# Altium schematic symbol library BARKO_SCHLIB.SchLib: 1064 symbols (part 4 of 11)
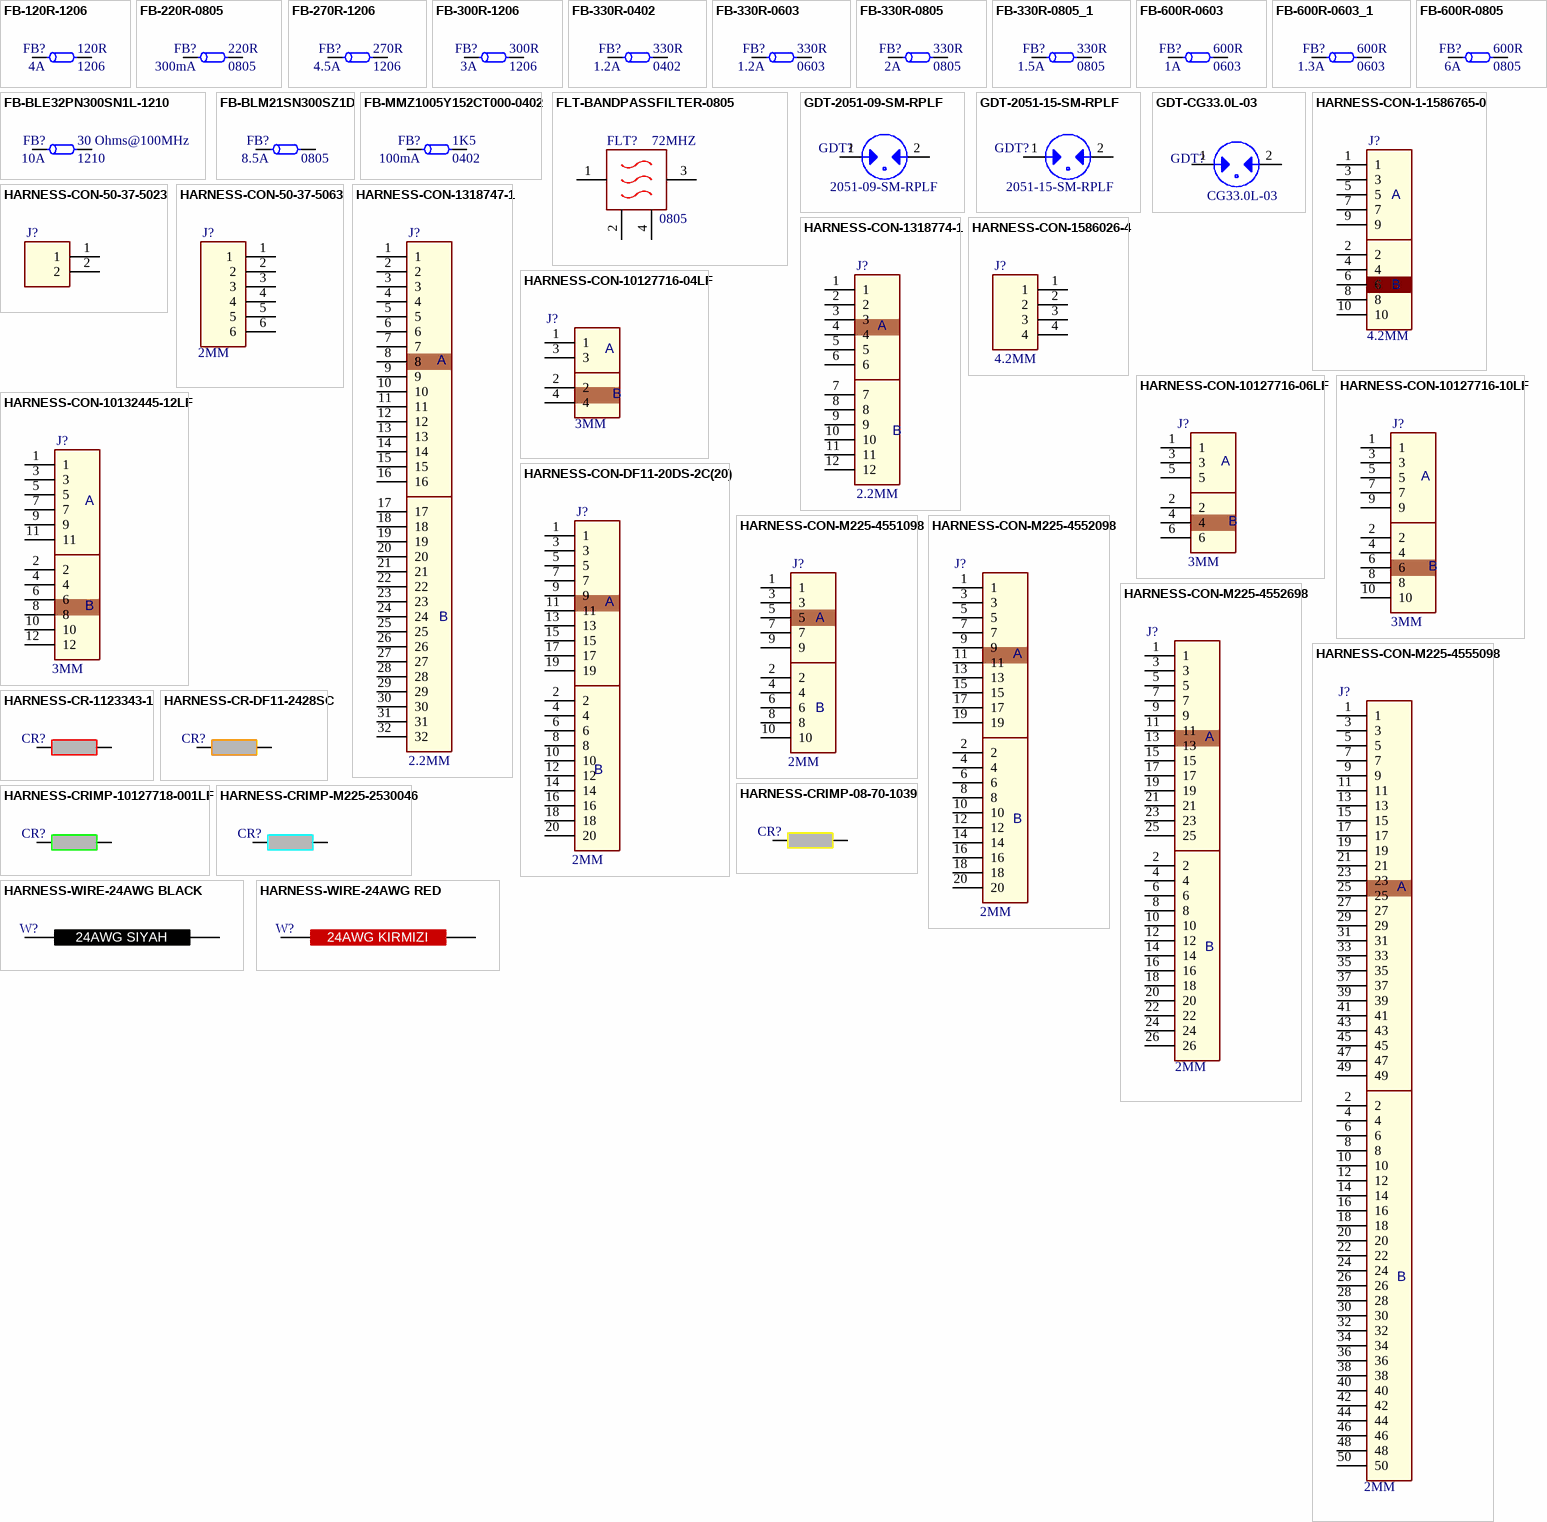
[diagram p44: symbols FB-120R-1206 to HARNESS-WIRE-24AWG RED]

## FB-300R-1206
designator FB?, comment 300R  Current Rating: 3A  Case Code (Imperial): 1206
FERRITE BEAD 300 OHM 1206 1LN; Manufacturer: Wurth Electronics; Manufacturer Part Number: 742792121; Tolerance: 25%; Number of Lines: 1; DC Resistance (DCR): 60mR; Inductance: 560nh; Test Frequency: 110MHz; .PCBCHK: USED; .Creator: F:TALI; Washability: OK; Supplier 1: Digi-Key; Stock 1: 17747; Pricing 1: 1=0.24, 10=0.238, 50=0.219, 100=0.209, 500=0.2, 1000=0.19 (USD); Mount: Surface Mount; Case/Package: SMD/SMT; Weight: 0.000353oz; Core Material: Ferrite; Case Code (Metric): 3216; Material: Ferrite; Min Operating Temperature: -55°C; Max Operating Temperature: 125°C; Package Quantity: 3000; Packaging: Tape and Reel; Impedance: 300R; Max Current Rating: 3A; Max DC Current: 3A; Termination: SMD/SMT; Length: 3.2mm; Height: 1.1mm; Width: 1.6mm; Depth: 1.6mm; REACH SVHC: Unknown; ComponentLink1URL: http://katalog.we-online.de/pbs/datasheet/742792121.pdf; ComponentLink1Description: http://katalog.we-online.de/pbs/datasheet/742792121.pdf; ComponentLink2URL: http://www.farnell.com/datasheets/1910965.pdf; ComponentLink2Description: http://www.farnell.com/datasheets/1910965.pdf; ComponentLink3URL: http://documents.rs-components.com/techlib://itc_doclist_GB.htm?stockno=6694137; ComponentLink3Description: http://documents.rs-components.com/techlib://itc_doclist_GB.htm?stockno=6694137; ComponentLink4URL: http://www.produktinfo.conrad.com/datenblaetter/1000000-1099999/001086998-da-01-ml-WE_CBF_SMD_FERRIT_742792121_de_en.pdf; ComponentLink4Description: http://www.produktinfo.conrad.com/datenblaetter/1000000-1099999/001086998-da-01-ml-WE_CBF_SMD_FERRIT_742792121_de_en.pdf; Supplier Part Number 1: 732-4654-6-ND; .SCHCHK: USED
footprint FB-1206
pins: 1, 2

## FB-330R-0402
designator FB?, comment 330R  Current Rating: 1.2A  Case Code (Imperial): 0402
FERRITE BEAD 330 OHM 0402 1LN; Manufacturer: Murata; Manufacturer Part Number: BLM15PX331SN1D; Material: Steel; Tolerance: 25%; Number of Lines: 1; DC Resistance (DCR): 150mR; Test Frequency: 100MHz; .PCBCHK: USED; .Creator: F:TALI; Washability: OK; Supplier 1: Digi-Key; Stock 1: 36751; Pricing 1: 1=0.15, 10=0.123, 25=0.0956, 50=0.0792, 100=0.0682, 250=0.05456, 500=0.0491, 1000=0.04092, 5000=0.03819 (USD); Case/Package: 0402; Number of Pins: 2; Weight: 2.3E-05oz; Case Code (Metric): 1005; Min Operating Temperature: -55°C; Max Operating Temperature: 125°C; Impedance: 330R; Package Quantity: 1; Packaging: Tape and Reel; Max Current Rating: 1.2A; Termination: SMD/SMT; Max DC Current: 1.2A; Number of Circuits: 1; Length: 1mm; Height: 0.5mm; Width: 0.5mm; Lead Free: Lead Free; ComponentLink1URL: http://search.murata.co.jp/Ceramy/image/img/w_hinm/L0110E.pdf; ComponentLink1Description: http://search.murata.co.jp/Ceramy/image/img/w_hinm/L0110E.pdf; ComponentLink2URL: http://www.produktinfo.conrad.com/datenblaetter/1100000-1199999/001172214-da-01-en-DROSSEL_0402_330R_1_0X0_5MM_10000ST.pdf; ComponentLink2Description: http://www.produktinfo.conrad.com/datenblaetter/1100000-1199999/001172214-da-01-en-DROSSEL_0402_330R_1_0X0_5MM_10000ST.pdf; Supplier Part Number 1: 490-11022-6-ND; .SCHCHK: USED
footprint FB-0402
pins: 1, 2

## FB-330R-0603
designator FB?, comment 330R  Case/Package: 0603  DC Current: 1.2A
FERRITE BEAD 330 OHM 0603 1LN; Manufacturer: Murata; Manufacturer Part Number: BLM18PG331SN1D; Material: Steel,Ferrite; Tolerance: 25%; DC Resistance (DCR): 150mR; Number of Lines: 1; Test Frequency: 100MHz; Shielding: Unshielded; Washability: OK; .Creator: M.OZKAN; .PCBCHK: USED; RoHS: Yes; Number of Pins: 2; Core Material: Ferrite; Case Code (Metric): 1608; Case Code (Imperial): 0603; Min Operating Temperature: -55°C; Max Operating Temperature: 125°C; Impedance: 330R; Package Quantity: 1; Packaging: Tape and Reel; Current Rating: 1.2A; Max Current Rating: 1.2A; Termination: SMD/SMT; Number of Circuits: 1; Length: 1.75mm; Height: 0.8mm; Width: 0.8mm; Depth: 0.95mm; Radiation Hardening: No; REACH SVHC: No SVHC; Lead Free: Lead Free; ComponentLink1URL: https://datasheet.ciiva.com/6211/enfa0003-6211710.pdf?src-supplier=Digi-Key; ComponentLink1Description: https://datasheet.ciiva.com/6211/enfa0003-6211710.pdf?src-supplier=Digi-Key; Max DC Current: 1.2A; .SCHCHK: USED; Supplier 1: Digi-Key; Supplier Part Number 1: 490-5222-1-ND; Stock: 106218; Pricing: 1=0.1, 10=0.076, 25=0.0684, 50=0.05, 100=0.0433, 250=0.0342, 500=0.0288, 1000=0.0243 (USD)
footprint FB-0603
pins: 1, 2

## FB-330R-0805
designator FB?, comment 330R  Current Rating: 2A  Case Code (Imperial): 0805
FERRITE BEAD 330 OHM 0805 1LN; Manufacturer: Wurth Electronics; Manufacturer Part Number: 742792037; Number of Lines: 1; DC Resistance (DCR): 80mR; Test Frequency: 100MHz; Tolerance: 25%; .PCBCHK: USED; .Creator: F:TALI; Washability: OK; Supplier 1: Digi-Key; Stock 1: 4000; Pricing 1: 4000=0.133 (USD); Mount: Surface Mount; Case/Package: SMD/SMT; Number of Pins: 2; Weight: 0.000388oz; Case Code (Metric): 2012; Material: Ferrite; Min Operating Temperature: -55°C; Max Operating Temperature: 125°C; Package Quantity: 1; Packaging: Tape and Reel; Impedance: 330R; Max Current Rating: 2A; Max DC Current: 2A; Termination: SMD/SMT; Resistance: 80mR; Length: 2mm; Height: 0.9mm; Width: 0.047inch; Depth: 1.2mm; REACH SVHC: Unknown; ComponentLink1URL: https://katalog.we-online.de/pbs/datasheet/742792037.pdf; ComponentLink1Description: https://katalog.we-online.de/pbs/datasheet/742792037.pdf; ComponentLink2URL: http://www.mouser.com/ds/2/445/742792037-538141.pdf; ComponentLink2Description: http://www.mouser.com/ds/2/445/742792037-538141.pdf; ComponentLink3URL: http://www.farnell.com/datasheets/530519.pdf; ComponentLink3Description: http://www.farnell.com/datasheets/530519.pdf; ComponentLink4URL: https://www.distrelec.biz/Web/Downloads/_t/ds/742792037_eng_tds.pdf?mime=application%2Fpdf; ComponentLink4Description: https://www.distrelec.biz/Web/Downloads/_t/ds/742792037_eng_tds.pdf?mime=application%2Fpdf; ComponentLink5URL: http://www.produktinfo.conrad.com/datenblaetter/1000000-1099999/001086963-da-01-ml-WE_CBF_SMD_FERRIT_742792037_de_en.pdf; ComponentLink5Description: http://www.produktinfo.conrad.com/datenblaetter/1000000-1099999/001086963-da-01-ml-WE_CBF_SMD_FERRIT_742792037_de_en.pdf; Supplier Part Number 1: 732-1619-2-ND; .SCHCHK: USED
footprint FB-0805
pins: 1, 2

## FB-330R-0805_1
designator FB?, comment 330R  Max Current Rating: 1.5A  Case Code (Imperial): 0805
FERRITE BEAD 330 OHM 0805 1LN; Manufacturer: Pulse Electronics; Manufacturer Part Number: PE-0805PFB331ST; Number of Lines: 1; DC Resistance (DCR): 100mR; .PCBCHK: USED; .Creator: F:TALI; Washability: OK; Supplier 1: Digi-Key; Stock 1: 2100; Pricing 1: 1=0.1, 10=0.073, 25=0.066, 50=0.0594, 100=0.0436, 250=0.03168, 500=0.02904, 1000=0.02508 (USD); Mount: Surface Mount; Case/Package: 0805; Case Code (Metric): 2012; Min Operating Temperature: -40°C; Max Operating Temperature: 105°C; Package Quantity: 1; Packaging: Tape and Reel; Length: 0.079inch; Height: 0.041inch; Width: 0.049inch; Supplier Part Number 1: 553-2394-6-ND; .SCHCHK: USED
footprint FB-0805
pins: 1, 2

## FB-600R-0603
designator FB?, comment 600R  Current Rating: 1A  Case Code (Imperial): 0603
FERRITE BEAD 600 OHM 0603 1LN; Manufacturer: Wurth Electronics; Manufacturer Part Number: 742792651; Tolerance: 25%; Number of Lines: 1; DC Resistance (DCR): 200mR; Test Frequency: 100MHz; Inductance: 0.36h; .PCBCHK: USED; .Creator: F:TALI; Washability: OK; Supplier 1: Digi-Key; Stock 1: 333766; Pricing 1: 1=0.16, 50=0.1572, 100=0.1451, 500=0.13846, 1000=0.13192 (EUR); Mount: Surface Mount; Case/Package: SMD/SMT; Weight: 0.000141oz; Case Code (Metric): 1608; Material: Ferrite; Core Material: Ferrite; Min Operating Temperature: -55°C; Max Operating Temperature: 125°C; Package Quantity: 1; Packaging: Tape and Reel; Impedance: 600R; Max Current Rating: 1A; Max DC Current: 1A; Termination: SMD/SMT; Resistance: 200mR; Length: 1.6mm; Height: 0.8mm; Width: 0.8mm; Depth: 0.8mm; REACH SVHC: Unknown; Lead Free: Lead Free; ComponentLink1URL: http://documents.rs-components.com/techlib://itc_doclist_GB.htm?stockno=6694046; ComponentLink1Description: http://documents.rs-components.com/techlib://itc_doclist_GB.htm?stockno=6694046; ComponentLink2URL: http://www.farnell.com/datasheets/1705833.pdf; ComponentLink2Description: http://www.farnell.com/datasheets/1705833.pdf; ComponentLink3URL: https://katalog.we-online.de/pbs/datasheet/742792651.pdf; ComponentLink3Description: https://katalog.we-online.de/pbs/datasheet/742792651.pdf; ComponentLink4URL: http://www.mouser.com/ds/2/445/742792651-538156.pdf; ComponentLink4Description: http://www.mouser.com/ds/2/445/742792651-538156.pdf; Supplier Part Number 1: 732-1593-1-ND; .SCHCHK: USED
footprint FB-0603
pins: 1, 2

## FB-600R-0603_1
designator FB?, comment 600R  Current Rating: 1.3A  Case Code (Imperial): 0603
FERRITE BEAD 600 OHM 0603 1LN; Manufacturer: Murata; Manufacturer Part Number: BLM18KG601SN1D; Material: Ferrite,Steel; Tolerance: 25%; DC Resistance (DCR): 150mR; Test Frequency: 100MHz; Number of Lines: 1; .PCBCHK: USED; .Creator: F:TALI; Washability: OK; Supplier 1: Digi-Key; Stock 1: 578615; Pricing 1: 1=0.1, 10=0.079, 25=0.0712, 50=0.0522, 100=0.0451, 250=0.03564, 500=0.0301, 1000=0.02534 (USD); Case/Package: 0603; Number of Pins: 2; Weight: 7.1E-05oz; Core Material: Ferrite; Case Code (Metric): 1608; Min Operating Temperature: -55°C; Max Operating Temperature: 125°C; Impedance: 600R; Package Quantity: 1; Packaging: Tape and Reel; Max Current Rating: 1.3A; Termination: SMD/SMT; Max DC Current: 1.3A; DC Current: 1.3A; Military Standard: Not; Number of Circuits: 1; Length: 1.6mm; Height: 0.8mm; Width: 0.8mm; Depth: 0.8mm; Radiation Hardening: No; REACH SVHC: No SVHC; Lead Free: Lead Free; ComponentLink1URL: https://www.verical.com/server-webapp/html/getDatasheet?partID=226848; ComponentLink1Description: https://www.verical.com/server-webapp/html/getDatasheet?partID=226848; ComponentLink2URL: http://www.murata.com/products/catalog/pdf/c31e.pdf; ComponentLink2Description: http://www.murata.com/products/catalog/pdf/c31e.pdf; ComponentLink3URL: http://www.farnell.com/datasheets/486545.pdf; ComponentLink3Description: http://www.farnell.com/datasheets/486545.pdf; ComponentLink4URL: https://media.digikey.com/pdf/Data%20Sheets/Murata%20PDFs/BLM18yyyyyyN1x.pdf; ComponentLink4Description: https://media.digikey.com/pdf/Data%20Sheets/Murata%20PDFs/BLM18yyyyyyN1x.pdf; ComponentLink5URL: http://uk.rs-online.com/webdocs/13ed/0900766b813ed050.pdf; ComponentLink5Description: http://uk.rs-online.com/webdocs/13ed/0900766b813ed050.pdf; Supplier Part Number 1: 490-5258-6-ND; .SCHCHK: USED
footprint FB-0603
pins: 1, 2

## FB-600R-0805
designator FB?, comment 600R  Current Rating: 6A  Case Code (Imperial): 0805
FERRITE BEAD 600 OHM 0805 1LN; Manufacturer: Bourns; Manufacturer Part Number: MH2029-601Y; Tolerance: 25%; DC Resistance (DCR): 200mR; Max DC Current: 1A; Number of Lines: 1; Test Frequency: 100MHz; .PCBCHK: USED; .Creator: F:TALI; Washability: OK; Supplier 1: Digi-Key; Stock 1: 677212; Pricing 1: 1=0.1, 10=0.073, 25=0.066, 50=0.0594, 100=0.0436, 250=0.03168, 500=0.02904, 1000=0.02508 (USD); Mount: Surface Mount; Case/Package: 0805; Core Material: Ferrite; Case Code (Metric): 2012; Min Operating Temperature: -55°C; Max Operating Temperature: 125°C; Impedance: 600R; Packaging: Tape and Reel; Package Quantity: 1; Max Current Rating: 1A; Termination: SMD/SMT; Length: 0.079inch; Height: 0.043inch; Depth: 1.4mm; Width: 0.031inch; REACH SVHC: No SVHC; ComponentLink1URL: http://www.bourns.com/data/global/pdfs/mh.pdf; ComponentLink1Description: http://www.bourns.com/data/global/pdfs/mh.pdf; ComponentLink2URL: http://www.bourns.com/docs/Product-Datasheets/mh.pdf; ComponentLink2Description: http://www.bourns.com/docs/Product-Datasheets/mh.pdf; ComponentLink3URL: https://www.bourns.com/docs/Product-Datasheets/mh.pdf; ComponentLink3Description: https://www.bourns.com/docs/Product-Datasheets/mh.pdf; Supplier Part Number 1: MH2029-601YDKR-ND; .SCHCHK: USED
footprint FB-0805
pins: 1, 2

## FB-BLE32PN300SN1L-1210
designator FB?, comment 30 Ohms@100MHz  Max DC Current: 10A  Case Code (Imperial): 1210
FERRITE BEAD 30 OHM 1210 1LN; Manufacturer: Murata; Manufacturer Part Number: BLE32PN300SN1L; Impedance: 30R; Resistance: 10R; Number of Lines: 1; DC Resistance (DCR): 1.6mR; .Creator: F:TALI; .PCBCHK: USED; Washability: OK; Supplier 1: Digi-Key; Stock 1: 15701; Pricing 1: 1=0.84, 10=0.756, 25=0.5604, 50=0.5324, 100=0.4763, 250=0.44828, 500=0.42026 (USD); Mount: Surface Mount; Case/Package: 1210; Weight: 0.000564oz; Core Material: Ferrite; Case Code (Metric): 3225; Min Operating Temperature: -55°C; Max Operating Temperature: 125°C; Packaging: Tape and Reel; Package Quantity: 1500; Max Current Rating: 10A; Termination: SMD/SMT; Length: 0.126inch; Height: 0.087inch; Width: 0.098inch; Depth: 2.5mm; Radiation Hardening: No; ComponentLink1URL: http://search.murata.co.jp/Ceramy/image/img/PDF/ENG/L0110S0100BLE32P.pdf?src-supplier=Avnet; ComponentLink1Description: http://search.murata.co.jp/Ceramy/image/img/PDF/ENG/L0110S0100BLE32P.pdf?src-supplier=Avnet; Supplier Part Number 1: 490-9566-6-ND; .SCHCHK: USED
footprint FB-1210
pins: 1, 2

## FB-BLM21SN300SZ1D
designator FB?, comment Max Current Rating: 8.5A  Case/Package: 0805  (hidden comment: BLM21SN300SZ1D)
FERRITE BEAD 30 OHM 0805 1LN; Manufacturer: Murata; Number of Lines: 1; DC Resistance (DCR): 4mR; Washability: OK; .Creator: M.OZKAN; .PCBCHK: USED; Supplier 1: Digi-Key; Supplier Part Number 1: 490-13267-1-ND; Manufacturer Part Number: BLM21SN300SZ1D; Stock 1: 2232; Pricing 1: 1=0.18000, 10=0.14900, 25=0.11560, 50=0.09580, 100=0.08250, 250=0.06600, 500=0.05940, 1000=0.04950 (USD); RoHS: Yes; Mount: Surface Mount; Case Code (Metric): 2012; Case Code (Imperial): 0805; Min Operating Temperature: -55°C; Max Operating Temperature: 125°C; Package Quantity: 1; Packaging: Tape and Reel; Length: 0.079inch; Height: 0.041inch; Width: 0.049inch; Ratings: AEC-Q200; ComponentLink1URL: https://media.digikey.com/pdf/Data%20Sheets/Murata%20PDFs/BLM_SN_Series_Br.pdf?src-supplier=Digi-Key; ComponentLink1Description: https://media.digikey.com/pdf/Data%20Sheets/Murata%20PDFs/BLM_SN_Series_Br.pdf?src-supplier=Digi-Key; .SCHCHK: USED
footprint FB-0805
pins: 1, 2

## FB-MMZ1005Y152CT000-0402
designator FB?, comment 1K5  Current Rating: 100mA  Case Code (Imperial): 0402
FERRITE BEAD 1.5 KOHM 0402 1LN; Manufacturer: TDK; Manufacturer Part Number: MMZ1005Y152CT000; Tolerance: 25%; Impedance: 1.5kR; DC Resistance (DCR): 1R; .Creator: F:TALI; .PCBCHK: USED; Test Frequency: 100MHz; Voltage Rating (DC): 80V; Number of Lines: 2; Current: 5A; Insulation Resistance: 10MR; Element Configuration: Dual; Shielding: Unshielded; Washability: OK; Supplier 1: Digi-Key; Stock 1: 148927; Pricing 1: 1=0.1, 10=0.073, 25=0.066, 50=0.0594, 100=0.0436, 250=0.03168, 500=0.02904, 1000=0.02508, 5000=0.0198 (USD); Mount: Surface Mount; Case/Package: 0402; Core Material: Ferrite; Case Code (Metric): 1005; Package Quantity: 10000; Packaging: Tape and Reel; Max DC Current: 100mA; Length: 0.039inch; Height: 0.022inch; Width: 0.02inch; REACH SVHC: No SVHC; Lead Free: Lead Free; ComponentLink1URL: https://media.digikey.com/pdf/Data%20Sheets/TDK%20PDFs/MMZ_Series_Br.pdf?src-supplier=Digi-Key; ComponentLink1Description: https://media.digikey.com/pdf/Data%20Sheets/TDK%20PDFs/MMZ_Series_Br.pdf?src-supplier=Digi-Key; Supplier Part Number 1: 445-2158-6-ND; .SCHCHK: USED; RoHS: Yes; Number of Pins: 4; Min Operating Temperature: -40°C; Max Operating Temperature: 85°C; Termination: SMD/SMT; Voltage Rating: 80V; DC Current: 5A; Depth: 6.2mm; Radiation Hardening: No; ComponentLink2URL: https://datasheet.ciiva.com/15191/getdatasheetpartid-659291-15191802.pdf?src-supplier=Verical; ComponentLink2Description: https://datasheet.ciiva.com/15191/getdatasheetpartid-659291-15191802.pdf?src-supplier=Verical; ComponentLink3URL: https://datasheet.ciiva.com/6216/e9713-acm-6216069.pdf?src-supplier=Digi-Key; ComponentLink3Description: https://datasheet.ciiva.com/6216/e9713-acm-6216069.pdf?src-supplier=Digi-Key; ComponentLink4URL: https://datasheet.ciiva.com/4942/e9713-acm-16715-4942071.pdf?src-supplier=Mouser; ComponentLink4Description: https://datasheet.ciiva.com/4942/e9713-acm-16715-4942071.pdf?src-supplier=Mouser; ComponentLink5URL: https://datasheet.ciiva.com/6216/e9713-acm-6216072.pdf?src-supplier=Digi-Key; ComponentLink5Description: https://datasheet.ciiva.com/6216/e9713-acm-6216072.pdf?src-supplier=Digi-Key; ComponentLink6URL: https://datasheet.ciiva.com/28376/e9713-acm-28376280.pdf?src-supplier=Avnet+Europe; ComponentLink6Description: https://datasheet.ciiva.com/28376/e9713-acm-28376280.pdf?src-supplier=Avnet+Europe; ComponentLink7URL: https://datasheet.ciiva.com/22726/1866262-22726282.pdf?src-supplier=Element14; ComponentLink7Description: https://datasheet.ciiva.com/22726/1866262-22726282.pdf?src-supplier=Element14; ComponentLink8URL: https://datasheet.ciiva.com/22726/1866262-22726284.pdf?src-supplier=Element14; ComponentLink8Description: https://datasheet.ciiva.com/22726/1866262-22726284.pdf?src-supplier=Element14; ComponentLink9URL: https://datasheet.ciiva.com/6216/e9713-acm-6216078.pdf?src-supplier=Digi-Key; ComponentLink9Description: https://datasheet.ciiva.com/6216/e9713-acm-6216078.pdf?src-supplier=Digi-Key
footprint FB-0402
pins: 1, 2

## FLT-BANDPASSFILTER-0805
designator FLT?  Package: 0805  BW: 72MHZ
FILTER BANDPASS WLAN&BLUETOOTH; Manufacturer: TDK; Manufacturer Part Number: DEA202450BT-1294C1-H; .Creator: F:TALI; .PCBCHK: USED; Washability: OK; Supplier 1: Digi-Key; Stock 1: 141744; Pricing 1: 1=0.35, 10=0.329, 25=0.314, 50=0.304, 100=0.2938, 250=0.2786, 500=0.23302, 1000=0.18084 (USD); Packaging: Tape and Reel; Package Quantity: 2000; Supplier Part Number 1: 445-172335-6-ND; .SCHCHK: USED
footprint FILTER-0805
pins: 1, 2, 3, 4

## GDT-2051-09-SM-RPLF
designator GDT?, comment 2051-09-SM-RPLF
GDT 90V 30% 2KA SURFACE MOUNT; Manufacturer: Bourns; Number of Terminals/Pins: 2; Fail Short: No; Peak Pulse Current: 1A; Approvals: UL; Supplier 1: Digi-Key; Supplier Part Number 1: 2051-09-SM-RPLFCT-ND; Manufacturer Part Number: 2051-09-SM-RPLF; Stock: 108797; Pricing: 1=0.72, 5=0.698, 10=0.677, 50=0.5698, 100=0.473, 250=0.43, 500=0.3655, 1000=0.3225 (USD); RoHS: Yes; Mount: Surface Mount; Case/Package: SMD/SMT; Case Code (Metric): 4532; Case Code (Imperial): 1812; Contact Plating: Tin; Min Operating Temperature: -40°C; Max Operating Temperature: 90°C; Packaging: Tape and Reel; Package Quantity: 2500; Termination: SMD/SMT; Tolerance: 30%; Number of Poles: 2; Length: 4.5mm; Height: 2.7mm; Depth: 3.2mm; REACH SVHC: No SVHC; ComponentLink1URL: https://datasheet.ciiva.com/11795/0900766b80f83dcf-11795101.pdf?src-supplier=RSComponents; ComponentLink1Description: https://datasheet.ciiva.com/11795/0900766b80f83dcf-11795101.pdf?src-supplier=RSComponents; ComponentLink2URL: https://datasheet.ciiva.com/1272/1846247-1272737.pdf?src-supplier=Element14; ComponentLink2Description: https://datasheet.ciiva.com/1272/1846247-1272737.pdf?src-supplier=Element14; ComponentLink3URL: https://datasheet.ciiva.com/1273/1846247-1273347.pdf?src-supplier=Element14; ComponentLink3Description: https://datasheet.ciiva.com/1273/1846247-1273347.pdf?src-supplier=Element14; ComponentLink4URL: https://datasheet.ciiva.com/7495/2051-7495226.pdf?src-supplier=Digi-Key; ComponentLink4Description: https://datasheet.ciiva.com/7495/2051-7495226.pdf?src-supplier=Digi-Key; ComponentLink5URL: https://datasheet.ciiva.com/7495/2051-7495231.pdf?src-supplier=Digi-Key; ComponentLink5Description: https://datasheet.ciiva.com/7495/2051-7495231.pdf?src-supplier=Digi-Key
footprint GDT-1812
pins: 1, 2

## GDT-2051-15-SM-RPLF
designator GDT?, comment 2051-15-SM-RPLF
GDT 150V 2KA 2 POLE SMD; Manufacturer: Bourns; Number of Terminals/Pins: 2; Tolerance: 30%; Fail Short: No; Peak Pulse Current: 1A; Supplier 1: Digi-Key; Supplier Part Number 1: 2051-15-SM-RPLFCT-ND; Manufacturer Part Number: 2051-15-SM-RPLF; Stock: 13533; Pricing: 1=0.72, 5=0.698, 10=0.677, 50=0.5698, 100=0.473, 250=0.43, 500=0.3655, 1000=0.3225 (USD); RoHS: Yes; Mount: Surface Mount; Case/Package: SMD/SMT; Contact Plating: Tin; Case Code (Metric): 4532; Case Code (Imperial): 1812; Min Operating Temperature: -40°C; Max Operating Temperature: 90°C; Package Quantity: 1; Packaging: Tape and Reel; Number of Poles: 2; Termination: SMD/SMT; Length: 4.5mm; Height: 2.7mm; Depth: 3.2mm; REACH SVHC: No SVHC; ComponentLink1URL: https://datasheet.ciiva.com/4498/2051-72669-4498899.pdf?src-supplier=Mouser; ComponentLink1Description: https://datasheet.ciiva.com/4498/2051-72669-4498899.pdf?src-supplier=Mouser; ComponentLink2URL: https://datasheet.ciiva.com/11795/0900766b80f83dcf-11795110.pdf?src-supplier=RSComponents; ComponentLink2Description: https://datasheet.ciiva.com/11795/0900766b80f83dcf-11795110.pdf?src-supplier=RSComponents; ComponentLink3URL: https://datasheet.ciiva.com/1272/1846247-1272738.pdf?src-supplier=Element14; ComponentLink3Description: https://datasheet.ciiva.com/1272/1846247-1272738.pdf?src-supplier=Element14; ComponentLink4URL: https://datasheet.ciiva.com/1273/1846247-1273348.pdf?src-supplier=Element14; ComponentLink4Description: https://datasheet.ciiva.com/1273/1846247-1273348.pdf?src-supplier=Element14; ComponentLink5URL: https://datasheet.ciiva.com/7495/2051-7495321.pdf?src-supplier=Digi-Key; ComponentLink5Description: https://datasheet.ciiva.com/7495/2051-7495321.pdf?src-supplier=Digi-Key; ComponentLink6URL: https://datasheet.ciiva.com/7495/2051-7495311.pdf?src-supplier=Digi-Key; ComponentLink6Description: https://datasheet.ciiva.com/7495/2051-7495311.pdf?src-supplier=Digi-Key; ComponentLink7URL: https://datasheet.ciiva.com/7495/2051-7495327.pdf?src-supplier=Digi-Key; ComponentLink7Description: https://datasheet.ciiva.com/7495/2051-7495327.pdf?src-supplier=Digi-Key
footprint GDT-1812
pins: 1, 2

## GDT-CG33.0L-03
designator GDT?, comment CG33.0L-03
GAS DISCHARGE TUBE, 2 POL, 5000A, 4200V; Manufacturer: Littelfuse; Number of Poles: 2; Fail Short: No; Peak Pulse Current: 10A; Insulation Resistance: 10GR; Breakdown Voltage: 3.6kV; Supplier 1: Digi-Key; Supplier Part Number 1: F11238-ND; Manufacturer Part Number: CG33.0L-03; Stock: 262; Pricing: 1=3.66, 5=3.538, 10=3.416, 50=2.684, 100=2.196, 250=2.135 (USD); RoHS: Yes; Mount: Through Hole; Case/Package: Axial; Number of Pins: 2; Min Operating Temperature: -40°C; Max Operating Temperature: 90°C; Packaging: Tray; Package Quantity: 350; Diameter: 8mm; Length: 62mm; REACH SVHC: No SVHC; ComponentLink1URL: https://datasheet.ciiva.com/1272/1142683-1272904.pdf?src-supplier=Element14; ComponentLink1Description: https://datasheet.ciiva.com/1272/1142683-1272904.pdf?src-supplier=Element14; ComponentLink2URL: https://datasheet.ciiva.com/12089/littelfuse-gdt-ac-cg3-series-12089275.pdf?src-supplier=Mouser; ComponentLink2Description: https://datasheet.ciiva.com/12089/littelfuse-gdt-ac-cg3-series-12089275.pdf?src-supplier=Mouser
footprint FP-CG33_0L-03
pins: 1, 2

## HARNESS-CON-1-1586765-0
designator J?, comment 4.2MM  (net tie)
CONN RCPT HSG 10POS 4.20MM; Manufacturer: TE Connectivity; Manufacturer Part Number: 1-1586765-0; Number of Contacts: 10; Max Voltage Rating (AC): 600V; Current Rating: 9A; Wire/Cable Type: Discrete; Connector System: Wire-to-Wire; Contact Retention: No (Without); Connector Type: Socket; Insulation Diameter: 0.122inch; Row Spacing: 4.2inch; Approvals: CSA; Washability: OK; .Creator: M.OZKAN; .PCBCHK: USED; Supplier 1: Digi-Key; Supplier Part Number 1: A142180-ND; Stock: 5000; Pricing: 1=0.41, 10=0.392, 25=0.336, 50=0.2856, 100=0.2744, 250=0.2464, 500=0.2352, 1000=0.196, 2500=0.1792 (USD); RoHS: Yes; Mount: Free Hanging,Cable; Color: White; Housing Color: White; Housing Material: Polyamide; Min Operating Temperature: -40°C; Max Operating Temperature: 221°C; Number of Rows: 2; Orientation: Straight; Package Quantity: 500; Fastening Type: Latch; Voltage Rating: 600V; Sealable: No (Without); Selectively Loaded: No (Without); Number of Positions: 10; Termination: Crimp; Packaging: Bag; Length: 22.2mm; Height: 0.464inch; Pitch: 4.2mm; Width: 20mm; Depth: 20mm; Radiation Hardening: No; ELV: Compliant; Flammability Rating: UL94 V-2; ComponentLink1URL: https://datasheet.ciiva.com/10390/eng-ds-7-1773453-1-val-u-lok-glow-wire-1208-10390566.pdf?src-supplier=Avnet; ComponentLink1Description: https://datasheet.ciiva.com/10390/eng-ds-7-1773453-1-val-u-lok-glow-wire-1208-10390566.pdf?src-supplier=Avnet; ComponentLink2URL: https://datasheet.ciiva.com/763/eng-cd-1586765-e-763928.pdf?src-supplier=Digi-Key; ComponentLink2Description: https://datasheet.ciiva.com/763/eng-cd-1586765-e-763928.pdf?src-supplier=Digi-Key; ComponentLink3URL: https://datasheet.ciiva.com/16660/eng-ds-7-1773453-1-val-u-lok-glow-wire-1208-16660985.pdf?src-supplier=Avnet+Europe; ComponentLink3Description: https://datasheet.ciiva.com/16660/eng-ds-7-1773453-1-val-u-lok-glow-wire-1208-16660985.pdf?src-supplier=Avnet+Europe; .SCHCHK: USED
pins: 1, 2, 3, 4, 5, 6, 7, 8, 9, 10
text: A; B

## HARNESS-CON-50-37-5023
designator J?, comment CONN HOUSING 2POS 2.5MM SHROUD  (value not drawn)
Manufacturer: Molex; Connector Type: Power,Rectangular; Number of Positions: 2; Gender: Receptacle; Working Voltage: 250V; Current Rating: 3A; Number of Circuits: 8; Shrouded: Yes (With); Approvals: UL,CSA; Glow Wire Compliant: Non-compliant; Division: HARNESS; Washability: OK; .Creator: M.OZKAN; .PCBCHK: USED; Supplier 1: Mouser; Manufacturer Part Number: 50-37-5023; Stock 1: 24971; Pricing 1: 1=0,15000, 10=0,09000, 100=0,07200, 1000=0,06300, 2500=0,05400, 10000=0,04800 (USD); RoHS: Yes; Mount: Cable,PCB; Housing Material: Polyamide; Material: Nylon,Polyamide; Min Operating Temperature: -40°C; Max Operating Temperature: 105°C; Termination: Crimp; Number of Rows: 1; Number of Contacts: 2; Contact Gender: Female; Package Quantity: 50000; Number of Poles: 2; Voltage Rating (AC): 250V; Packaging: Bulk; Orientation: Straight; Length: 7.4mm; Pitch: 2.5mm; Depth: 3.9mm; Width: 8mm; Radiation Hardening: No; Flammability Rating: UL94 V-0; Halogen Free: Low Halogen; Lead Free: Lead Free; REACH SVHC: Unknown; ComponentLink1URL: https://datasheet.ciiva.com/10392/0050375023-crimp-housings-10392096.pdf?src-supplier=Avnet; ComponentLink1Description: https://datasheet.ciiva.com/10392/0050375023-crimp-housings-10392096.pdf?src-supplier=Avnet; ComponentLink2URL: https://datasheet.ciiva.com/5154/0050375023-crimp-housings-160429-5154306.pdf?src-supplier=Mouser; ComponentLink2Description: https://datasheet.ciiva.com/5154/0050375023-crimp-housings-160429-5154306.pdf?src-supplier=Mouser; ComponentLink3URL: https://datasheet.ciiva.com/11740/0900766b80d882ed-11740610.pdf?src-supplier=RSComponents; ComponentLink3Description: https://datasheet.ciiva.com/11740/0900766b80d882ed-11740610.pdf?src-supplier=RSComponents; ComponentLink4URL: https://datasheet.ciiva.com/30096/0050375023-crimp-housings-30096067.pdf?src-supplier=Onlinecomponents.com; ComponentLink4Description: https://datasheet.ciiva.com/30096/0050375023-crimp-housings-30096067.pdf?src-supplier=Onlinecomponents.com; ComponentLink5URL: https://datasheet.ciiva.com/15226/getdatasheetpartid-175297-15226391.pdf?src-supplier=Verical; ComponentLink5Description: https://datasheet.ciiva.com/15226/getdatasheetpartid-175297-15226391.pdf?src-supplier=Verical; ComponentLink6URL: https://datasheet.ciiva.com/16128/472480050375023-crimp-housings-16128361.pdf?src-supplier=Onlinecomponents.com; ComponentLink6Description: https://datasheet.ciiva.com/16128/472480050375023-crimp-housings-16128361.pdf?src-supplier=Onlinecomponents.com; ComponentLink7URL: https://datasheet.ciiva.com/16468/0050375023-crimp-housings-16468709.pdf?src-supplier=Avnet+Asia; ComponentLink7Description: https://datasheet.ciiva.com/16468/0050375023-crimp-housings-16468709.pdf?src-supplier=Avnet+Asia; ComponentLink8URL: https://datasheet.ciiva.com/8004/1881433-8004187.pdf?src-supplier=Element14; ComponentLink8Description: https://datasheet.ciiva.com/8004/1881433-8004187.pdf?src-supplier=Element14; ComponentLink9URL: https://datasheet.ciiva.com/16660/0050375023-crimp-housings-16660892.pdf?src-supplier=Avnet+Europe; ComponentLink9Description: https://datasheet.ciiva.com/16660/0050375023-crimp-housings-16660892.pdf?src-supplier=Avnet+Europe; Supplier Part Number 1: 538-50-37-5023; .SCHCHK: USED
pins: 1, 2

## HARNESS-CON-50-37-5063
designator J?, comment 2MM
CONN HOUSING 6POS 2.5MM SHROUD; Manufacturer: Molex; Gender: Receptacle; Voltage Rating (AC): 250V; Connector Type: Receptacle,Socket,Power,Rectangular; Test Voltage: 1kV; Insulation Resistance: 1GR; Shrouded: Yes (With); Number of Positions: 6; Current Rating: 3A; Glow Wire Compliant: Non-compliant; Division: HARNESS; Washability: OK; .Creator: M.OZKAN; .PCBCHK: USED; Supplier 1: Mouser; Manufacturer Part Number: 50-37-5063; Stock 1: 22260; Pricing 1: 1=0,41000, 10=0,28600, 100=0,23600, 1000=0,19600, 2500=0,16800, 10000=0,15100 (USD); RoHS: Yes; Mount: Free Hanging,Cable,PCB; Material: Nylon,Polyamide; Housing Material: Polyamide; Min Operating Temperature: -40°C; Max Operating Temperature: 105°C; Packaging: Bulk; Termination: Crimp; Number of Contacts: 6; Working Voltage: 250V; Orientation: Straight; Package Quantity: 10; Number of Rows: 1; Fastening Type: Ramp; Number of Poles: 6; Contact Gender: Female; Length: 17.4mm; Pitch: 2.5mm; Depth: 3.9mm; Width: 8mm; Radiation Hardening: No; Lead Free: Lead Free; Halogen Free: Low Halogen; Flammability Rating: UL94 V-0; REACH SVHC: Unknown; ComponentLink1URL: https://datasheet.ciiva.com/759/050375053-sd-759504.pdf?src-supplier=Digi-Key; ComponentLink1Description: https://datasheet.ciiva.com/759/050375053-sd-759504.pdf?src-supplier=Digi-Key; ComponentLink2URL: https://datasheet.ciiva.com/30067/0050375063-crimp-housings-30067906.pdf?src-supplier=Onlinecomponents.com; ComponentLink2Description: https://datasheet.ciiva.com/30067/0050375063-crimp-housings-30067906.pdf?src-supplier=Onlinecomponents.com; ComponentLink3URL: https://datasheet.ciiva.com/11740/0900766b80da7728-11740579.pdf?src-supplier=RSComponents; ComponentLink3Description: https://datasheet.ciiva.com/11740/0900766b80da7728-11740579.pdf?src-supplier=RSComponents; ComponentLink4URL: https://datasheet.ciiva.com/5155/0050375063-crimp-housings-160457-5155175.pdf?src-supplier=Mouser; ComponentLink4Description: https://datasheet.ciiva.com/5155/0050375063-crimp-housings-160457-5155175.pdf?src-supplier=Mouser; ComponentLink5URL: https://datasheet.ciiva.com/10391/0050375063-crimp-housings-10391978.pdf?src-supplier=Avnet; ComponentLink5Description: https://datasheet.ciiva.com/10391/0050375063-crimp-housings-10391978.pdf?src-supplier=Avnet; ComponentLink6URL: https://datasheet.ciiva.com/16128/374960050375063-crimp-housings-16128332.pdf?src-supplier=Onlinecomponents.com; ComponentLink6Description: https://datasheet.ciiva.com/16128/374960050375063-crimp-housings-16128332.pdf?src-supplier=Onlinecomponents.com; ComponentLink7URL: https://datasheet.ciiva.com/7917/1881436-7917003.pdf?src-supplier=Element14; ComponentLink7Description: https://datasheet.ciiva.com/7917/1881436-7917003.pdf?src-supplier=Element14; ComponentLink8URL: https://datasheet.ciiva.com/16660/0050375063-crimp-housings-16660733.pdf?src-supplier=Avnet+Europe; ComponentLink8Description: https://datasheet.ciiva.com/16660/0050375063-crimp-housings-16660733.pdf?src-supplier=Avnet+Europe; Supplier Part Number 1: 538-50-37-5063; .SCHCHK: USED
pins: 1 1 , 2, 3, 4, 5, 6

## HARNESS-CON-1318747-1
designator J?, comment 2.2MM  (net tie)
CONN PLUG HSG 32POS 2.20MM; Manufacturer: TE Connectivity; Manufacturer Part Number: 1318747-1; Body Material: PBT; Circuit Application: Signal; Connector System: Wire-to-Wire; Hybrid Connector: No; Polarized: Yes; Sealable: No (Without); Max Voltage Rating (DC): 12V; Gender: Male; Connector Type: Plug,Socket,Receptacle; Number of Positions: 32; Mating Tab Width: 0.025inch; Pitch: 0.087inch; Row Spacing: 0.232inch; .Creator: M.OZKAN; .PCBCHK: USED; Supplier 1: Digi-Key; Supplier Part Number 1: A122011-ND; Stock: 222; Pricing: 1=3.33, 10=3.193, 25=2.9268, 50=2.794, 100=2.6609, 250=2.3283, 500=2.2617, 1000=1.9291, 2500=1.7961 (USD); RoHS: Yes; Mount: Free Hanging; Color: Natural; Housing Material: Polybutylene; Housing Color: Natural; Min Operating Temperature: -22°C; Max Operating Temperature: 221°C; Serviceable: Yes; Strain Relief: No (Without); Package Quantity: 100; Number of Rows: 2; Fastening Type: Ramp; Packaging: Bag; Orientation: Straight; Voltage Rating: 12V; Termination: Crimp; Number of Contacts: 32; Length: 21mm; Height: 0.622inch; Width: 1.472inch; Depth: 21mm; Radiation Hardening: No; ELV: Compliant; REACH SVHC: No SVHC; Flammability Rating: UL94 HB; ComponentLink1URL: https://datasheet.ciiva.com/22776/1699067-tif-22776963.pdf?src-supplier=Farnell; ComponentLink1Description: https://datasheet.ciiva.com/22776/1699067-tif-22776963.pdf?src-supplier=Farnell; ComponentLink2URL: https://datasheet.ciiva.com/5149/pn-cd-1318747-a1-142586-5149941.pdf?src-supplier=Mouser; ComponentLink2Description: https://datasheet.ciiva.com/5149/pn-cd-1318747-a1-142586-5149941.pdf?src-supplier=Mouser; ComponentLink3URL: https://datasheet.ciiva.com/11741/0900766b80ed2a90-11741067.pdf?src-supplier=RSComponents; ComponentLink3Description: https://datasheet.ciiva.com/11741/0900766b80ed2a90-11741067.pdf?src-supplier=RSComponents; ComponentLink4URL: https://datasheet.ciiva.com/30094/eng-cat-124962-0304-536-30094026.pdf?src-supplier=Onlinecomponents.com; ComponentLink4Description: https://datasheet.ciiva.com/30094/eng-cat-124962-0304-536-30094026.pdf?src-supplier=Onlinecomponents.com; .SCHCHK: USED
pins: 1, 2, 3, 4, 5, 6, 7, 8, 9, 10, 11, 12, 13, 14, 15, 16, 17, 18, 19, 20, 21, 22, 23, 24, 25, 26, 27, 28, 29, 30, 31, 32
text: A; B

## HARNESS-CON-1318774-1
designator J?, comment 2.2MM
CONN PLUG HSG 12POS 2.20MM; Manufacturer: TE Connectivity; Manufacturer Part Number: 1318774-1; Body Material: PBT; Number of Positions: 12; Connector Type: Plug,Socket; Circuit Application: Signal; Connector System: Wire-to-Wire; Hybrid Connector: No; Polarized: Yes; Sealable: No (Without); Gender: Male; Voltage Rating: 12V; Pitch: 0.087inch; Row Spacing: 0.232inch; Mating Tab Width: 0.025inch; .Creator: M.OZKAN; .PCBCHK: USED; Supplier 1: Digi-Key; Supplier Part Number 1: A122296-ND; Stock: 2582; Pricing: 1=2.7, 10=2.593, 25=2.3772, 50=2.2692, 100=2.1611, 250=1.891, 500=1.8369, 1000=1.5668, 2500=1.4587 (USD); RoHS: Yes; Mount: Free Hanging,Cable; Housing Material: Polybutylene; Housing Color: Natural; Color: Natural; Min Operating Temperature: -22°C; Max Operating Temperature: 221°C; Orientation: Straight; Termination: Crimp; Number of Contacts: 12; Serviceable: Yes; Strain Relief: No (Without); Packaging: Bag; Package Quantity: 100; Number of Rows: 2; Fastening Type: Ramp; Length: 21mm; Height: 0.622inch; Depth: 21mm; Width: 15.4mm; Radiation Hardening: No; Lead Free: Lead Free; ELV: Compliant; Flammability Rating: UL94 HB; ComponentLink1URL: https://datasheet.ciiva.com/30163/eng-cat-124962-0304-539-30163324.pdf?src-supplier=Onlinecomponents.com; ComponentLink1Description: https://datasheet.ciiva.com/30163/eng-cat-124962-0304-539-30163324.pdf?src-supplier=Onlinecomponents.com; ComponentLink2URL: https://datasheet.ciiva.com/11741/0900766b80ed2a99-11741327.pdf?src-supplier=RSComponents; ComponentLink2Description: https://datasheet.ciiva.com/11741/0900766b80ed2a99-11741327.pdf?src-supplier=RSComponents; .SCHCHK: USED
pins: 1, 2, 3, 4, 5, 6, 7, 8, 9, 10, 11, 12
text: A; B

## HARNESS-CON-1586026-4
designator J?, comment 4.2MM
CONN RCPT HOUSING 4POS SGL 4.2MM; Manufacturer: TE Connectivity; Manufacturer Part Number: 1586026-4; Number of Contacts: 4; Connector Type: Socket; Current Rating: 9A; Gender: Receptacle; Max Voltage Rating (AC): 600V; Wire/Cable Type: Discrete; Connector System: Wire-to-Wire; Contact Retention: No (Without); VDE Tested: No; Insulation Diameter: 0.122inch; Approvals: CSA; Washability: OK; .Creator: M.OZKAN; .PCBCHK: USED; Supplier 1: Digi-Key; Supplier Part Number 1: A99261-ND; Stock: 4594; Pricing: 1=0.32, 10=0.304, 25=0.2604, 50=0.2214, 100=0.2127, 250=0.191, 500=0.1823, 1000=0.1519, 2500=0.1389 (USD); RoHS: Yes; Mount: Free Hanging; Material: Nylon; Color: Natural,Beige; Contact Material: Bronze,Brass; Contact Plating: Tin,Gold; Housing Color: Natural; Housing Material: Nylon; Min Operating Temperature: -40°C; Max Operating Temperature: 221°C; Number of Rows: 1; Orientation: Straight; Number of Positions: 4; Termination: Crimp; Contact Gender: Female; Package Quantity: 1000; Fastening Type: Latch; Packaging: Bag; Sealable: No (Without); Selectively Loaded: No (Without); Length: 0.7087inch; Height: 0.295inch; Pitch: 4.2mm; Depth: 19.8mm; Width: 0.779inch; Radiation Hardening: No; REACH SVHC: Unknown; Flammability Rating: UL94 V-2; ComponentLink1URL: https://datasheet.ciiva.com/761/eng-cd-1586026-d-761754.pdf?src-supplier=Digi-Key; ComponentLink1Description: https://datasheet.ciiva.com/761/eng-cd-1586026-d-761754.pdf?src-supplier=Digi-Key; ComponentLink2URL: https://datasheet.ciiva.com/761/eng-cd-1586026-d-761754.pdf?src-supplier=Farnell; ComponentLink2Description: https://datasheet.ciiva.com/761/eng-cd-1586026-d-761754.pdf?src-supplier=Farnell; ComponentLink3URL: https://datasheet.ciiva.com/11741/0900766b80da9b1a-11741654.pdf?src-supplier=RSComponents; ComponentLink3Description: https://datasheet.ciiva.com/11741/0900766b80da9b1a-11741654.pdf?src-supplier=RSComponents; ComponentLink4URL: https://datasheet.ciiva.com/16314/eng-ds-7-1773453-5-val-u-lok-single-row-headers-0911-16314473.pdf?src-supplier=Future+Electronics; ComponentLink4Description: https://datasheet.ciiva.com/16314/eng-ds-7-1773453-5-val-u-lok-single-row-headers-0911-16314473.pdf?src-supplier=Future+Electronics; ComponentLink5URL: https://datasheet.ciiva.com/41447/001174773-da-01-en-buchsengehaeuse-0-1586026-4-41447891.pdf?src-supplier=Conrad; ComponentLink5Description: https://datasheet.ciiva.com/41447/001174773-da-01-en-buchsengehaeuse-0-1586026-4-41447891.pdf?src-supplier=Conrad; ComponentLink6URL: https://datasheet.ciiva.com/14643/70041275-14643670.pdf?src-supplier=Allied+Electronics; ComponentLink6Description: https://datasheet.ciiva.com/14643/70041275-14643670.pdf?src-supplier=Allied+Electronics; ComponentLink7URL: https://datasheet.ciiva.com/10406/eng-cs-82181-softshell-high-density-0508-10406076.pdf?src-supplier=Avnet; ComponentLink7Description: https://datasheet.ciiva.com/10406/eng-cs-82181-softshell-high-density-0508-10406076.pdf?src-supplier=Avnet; ComponentLink8URL: https://datasheet.ciiva.com/16739/eng-cs-82181-softshell-high-density-0508-16739823.pdf?src-supplier=Avnet+Europe; ComponentLink8Description: https://datasheet.ciiva.com/16739/eng-cs-82181-softshell-high-density-0508-16739823.pdf?src-supplier=Avnet+Europe; ComponentLink9URL: https://datasheet.ciiva.com/30072/eng-cs-82181-softshell-high-density-0508-30072477.pdf?src-supplier=Onlinecomponents.com; ComponentLink9Description: https://datasheet.ciiva.com/30072/eng-cs-82181-softshell-high-density-0508-30072477.pdf?src-supplier=Onlinecomponents.com; .SCHCHK: USED
pins: 1, 2, 3, 4

## HARNESS-CON-10127716-04LF
designator J?, comment 3MM
CONN HOUSING 4POS .118" CRIMP; Manufacturer: Amphenol FCI; Manufacturer Part Number: 10127716-04LF; Max Current Rating: 5A; Connector Type: Receptacle,Socket; Number of Positions: 4; Gender: Female; Pitch: 0.118inch; Washability: OK; .Creator: M.OZKAN; .PCBCHK: USED; Supplier 1: Digi-Key; Supplier Part Number 1: 609-4816-ND; Stock: 3609; Pricing: 1=0.2, 10=0.185, 25=0.138, 50=0.1182, 100=0.1143, 250=0.0985, 500=0.0946, 1000=0.0828, 2500=0.0749 (USD); RoHS: Yes; Mount: Free Hanging,Cable; Housing Material: Nylon; Color: Black; Min Operating Temperature: -40°C; Max Operating Temperature: 105°C; Termination: Crimp; Fastening Type: Latch; Packaging: Bulk; Number of Rows: 2; Orientation: Straight; Length: 6.85mm; Row Spacing: 0.118inch; ComponentLink1URL: http://portal.fciconnect.com/Comergent//fci/drawing/10127716-xxlf.pdf?src-supplier=Digi-Key; ComponentLink1Description: http://portal.fciconnect.com/Comergent//fci/drawing/10127716-xxlf.pdf?src-supplier=Digi-Key; ComponentLink2URL: http://portal.fciconnect.com/Comergent//fci/drawing/10127716-xxlf.pdf?src-supplier=Avnet; ComponentLink2Description: http://portal.fciconnect.com/Comergent//fci/drawing/10127716-xxlf.pdf?src-supplier=Avnet; REACH SVHC: No SVHC; ComponentLink3URL: http://www.farnell.com/datasheets/1877473.pdf?src-supplier=Element14; ComponentLink3Description: http://www.farnell.com/datasheets/1877473.pdf?src-supplier=Element14; .SCHCHK: USED
pins: 1, 2, 3, 4
text: A; B

## HARNESS-CON-10127716-06LF
designator J?, comment 3MM
CONN HOUSING 6POS .118" CRIMP; Manufacturer: Amphenol FCI; Manufacturer Part Number: 10127716-06LF; Connector Type: Receptacle,Socket; Number of Positions: 6; Gender: Receptacle; Max Current Rating: 5A; Pitch: 0.118inch; Washability: OK; .Creator: M.OZKAN; .PCBCHK: USED; Supplier 1: Digi-Key; Supplier Part Number 1: 609-4817-ND; Stock: 9275; Pricing: 1=0.17, 10=0.161, 25=0.1372, 50=0.1202, 100=0.1115, 250=0.0987, 500=0.0944, 1000=0.0772, 2500=0.0708 (USD); RoHS: Yes; Mount: Free Hanging,Cable; Color: Black; Housing Material: Nylon; Min Operating Temperature: -40°C; Max Operating Temperature: 105°C; Packaging: Bulk; Number of Rows: 2; Termination: Crimp; Fastening Type: Latch; Orientation: Straight; Length: 9.85mm; Row Spacing: 0.118inch; REACH SVHC: No SVHC; ComponentLink1URL: http://portal.fciconnect.com/Comergent//fci/drawing/10127716-xxlf.pdf?src-supplier=Avnet; ComponentLink1Description: http://portal.fciconnect.com/Comergent//fci/drawing/10127716-xxlf.pdf?src-supplier=Avnet; ComponentLink2URL: http://www.farnell.com/datasheets/1877473.pdf?src-supplier=Element14; ComponentLink2Description: http://www.farnell.com/datasheets/1877473.pdf?src-supplier=Element14; ComponentLink3URL: http://portal.fciconnect.com/Comergent//fci/drawing/10127716-xxlf.pdf?src-supplier=Digi-Key; ComponentLink3Description: http://portal.fciconnect.com/Comergent//fci/drawing/10127716-xxlf.pdf?src-supplier=Digi-Key; .SCHCHK: USED
pins: 1, 2, 3, 4, 5, 6
text: A; B

## HARNESS-CON-10127716-10LF
designator J?, comment 3MM
CONN HOUSING 10POS .118" CRIMP; Manufacturer: Amphenol FCI; Manufacturer Part Number: 10127716-10LF; Connector Type: Receptacle,Socket; Number of Positions: 10; Gender: Receptacle; Max Current Rating: 5A; Pitch: 0.118inch; Washability: OK; .Creator: M.OZKAN; .PCBCHK: USED; Supplier 1: Digi-Key; Supplier Part Number 1: 609-4818-ND; Stock: 790; Pricing: 1=0.2, 10=0.186, 25=0.1588, 50=0.139, 100=0.129, 250=0.1142, 500=0.1092, 1000=0.0893, 2500=0.0819 (USD); RoHS: Yes; Mount: Free Hanging,Cable; Housing Material: Nylon; Color: Black; Min Operating Temperature: -40°C; Max Operating Temperature: 105°C; Packaging: Bulk; Number of Rows: 2; Termination: Crimp; Fastening Type: Latch; Orientation: Straight; Length: 15.85mm; Row Spacing: 0.118inch; REACH SVHC: No SVHC; ComponentLink1URL: http://portal.fciconnect.com/Comergent//fci/drawing/10127716-xxlf.pdf?src-supplier=Digi-Key; ComponentLink1Description: http://portal.fciconnect.com/Comergent//fci/drawing/10127716-xxlf.pdf?src-supplier=Digi-Key; ComponentLink2URL: http://portal.fciconnect.com/Comergent//fci/drawing/10127716-xxlf.pdf?src-supplier=Avnet; ComponentLink2Description: http://portal.fciconnect.com/Comergent//fci/drawing/10127716-xxlf.pdf?src-supplier=Avnet; ComponentLink3URL: http://www.farnell.com/datasheets/1877473.pdf?src-supplier=Element14; ComponentLink3Description: http://www.farnell.com/datasheets/1877473.pdf?src-supplier=Element14; .SCHCHK: USED
pins: 1, 2, 3, 4, 5, 6, 7, 8, 9, 10
text: A; B

## HARNESS-CON-10132445-12LF
designator J?, comment 3MM
CONN HOUSING 12POS .118" CRIMP; Manufacturer: Amphenol FCI; Manufacturer Part Number: 10132445-12LF; Washability: OK; .Creator: M.OZKAN; .PCBCHK: USED; Supplier 1: Digi-Key; Supplier Part Number 1: 609-5285-ND; Stock: 5693; Pricing: 1=0.22, 10=0.21, 100=0.1456, 500=0.1232, 1000=0.1008, 5000=0.0896, 10000=0.0812 (USD); RoHS: No; .SCHCHK: USED
pins: 1, 2, 3, 4, 5, 6, 7, 8, 9, 10, 11, 12
text: A; B

## HARNESS-CON-DF11-20DS-2C(20)
designator J?, comment 2MM
CONN SOCKET 20POS 2MM CRIMP; Manufacturer: Hirose; Manufacturer Part Number: DF11-20DS-2C(20); Connector Type: Receptacle,Socket; Number of Positions: 20; Pitch: 0.079inch; .Creator: M.OZKAN; .PCBCHK: USED; Supplier 1: Digi-Key; Supplier Part Number 1: H125949-ND; Stock: 1230; Pricing: 1=0.51, 10=0.474, 25=0.4268, 50=0.3792, 100=0.3634, 250=0.3318, 500=0.316, 1000=0.2607, 2500=0.237 (USD); RoHS: Yes; Mount: Free Hanging; Color: Black; Housing Material: Polyamide; Packaging: Bulk; Contact Gender: Female; Package Quantity: 100; Number of Rows: 2; Termination: Crimp; Row Spacing: 0.079inch; ComponentLink1URL: https://datasheet.ciiva.com/18564/en-df1-20130411-18564214.pdf?src-supplier=Digi-Key; ComponentLink1Description: https://datasheet.ciiva.com/18564/en-df1-20130411-18564214.pdf?src-supplier=Digi-Key; .SCHCHK: USED
pins: 1, 2, 3, 4, 5, 6, 7, 8, 9, 10, 11, 12, 13, 14, 15, 16, 17, 18, 19, 20
text: A; B

## HARNESS-CON-M225-4551098
designator J?, comment 2MM
CONN RECEPT 2MM 10POS; Manufacturer: Harwin; Manufacturer Part Number: M225-4551098; Division: HARNESS; Washability: OK; .Creator: M.OZKAN; .PCBCHK: USED; Supplier 1: Mouser; Stock 1: 150; Pricing 1: 1=6,72000, 10=5,60000, 100=5,32000, 250=4,76000, 500=4,48000, 1000=3,92000 (USD); RoHS: No; ComponentLink1URL: http://www.farnell.com/datasheets/2723656.pdf?src-supplier=Farnell; ComponentLink1Description: http://www.farnell.com/datasheets/2723656.pdf?src-supplier=Farnell; Supplier Part Number 1: 855-M225-4551098; .SCHCHK: USED
pins: 1, 2, 3, 4, 5, 6, 7, 8, 9, 10
text: A; B

## HARNESS-CON-M225-4552098
designator J?, comment 2MM  (net tie)